# Altium footprint library XU-GENARAL PCB .PcbLib: 1176 footprints (part 43 of 75)
Each footprint in its own frame and in the unit in brackets; x right, y up, seen from the top. Pads: shape width x height; smd on the part's side, far side on the other; paste and mask are expansions set on the pad; w line width, h text height; cw(c..) or ccw(c..) is an arc to the next point about the centre after c.
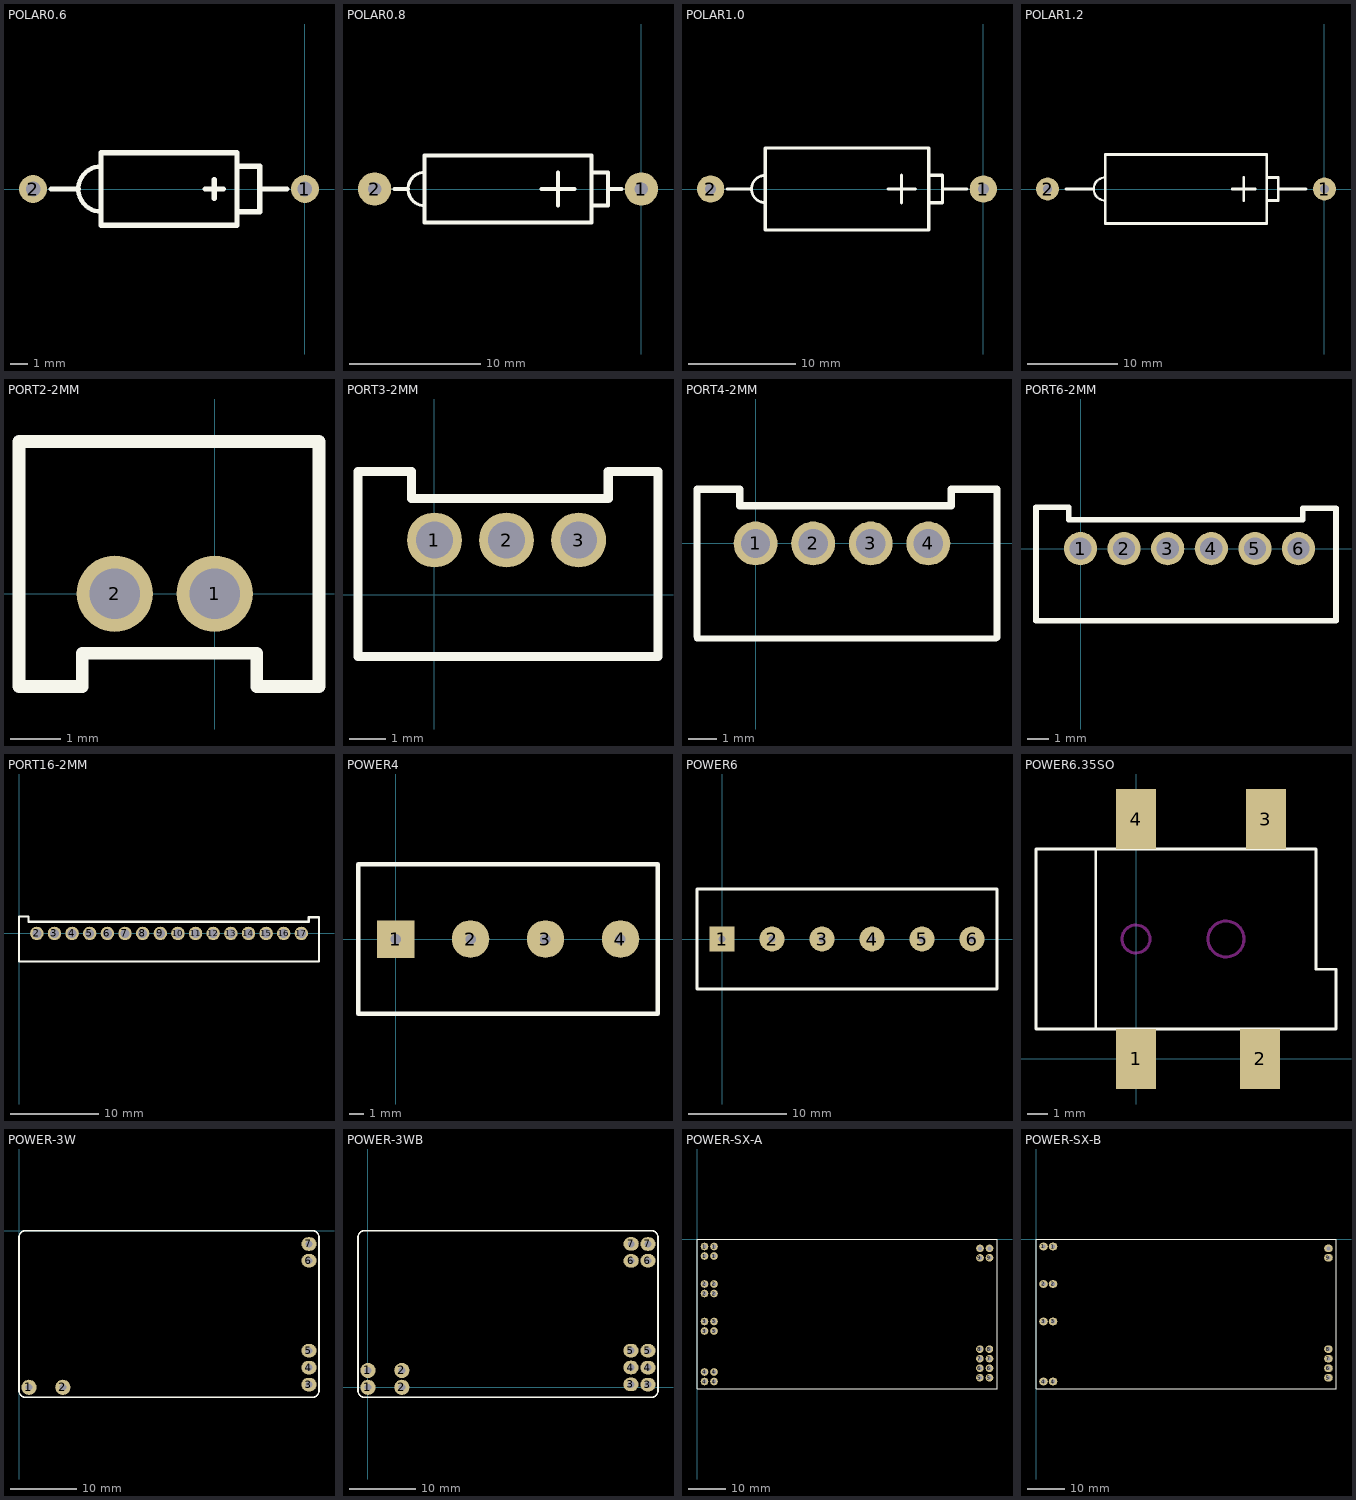
[diagram p42: the footprints below, top view; thin cyan lines are the x and y axes]

## POLAR0.6 [mil]
pads (2):
  round 62 hole 32: 1(0,0) 2(-600,0)
Top Overlay:
  lines w10: -450,-50 cw(c-450,0) -450,50
  lines w12: -560,0 -500,0 ; -220,0 -180,0 ; -200,-20 -200,20 ; -150,-50 -100,-50 -100,50 -150,50 ; -100,0 -40,0 ; -450,-80 -450,80 -150,80 -150,-80 -450,-80

## POLAR0.8 [mil]
pads (2):
  round 100 hole 40: 1(0,0) 2(-800,0)
Top Overlay:
  lines w10: -650,-50 cw(c-650,0) -650,50
  lines w12: -740,0 -700,0 ; -300,0 -200,0 ; -250,-50 -250,50 ; -150,-50 -100,-50 -100,50 -150,50 ; -100,0 -60,0 ; -650,-100 -650,100 -150,100 -150,-100 -650,-100

## POLAR1.0 [mil]
pads (2):
  round 100 hole 40: 1(0,0) 2(-1000,0)
Top Overlay:
  lines w10: -800,-50 cw(c-800,0) -800,50
  lines w12: -940,0 -850,0 ; -350,0 -250,0 ; -300,-50 -300,50 ; -200,-50 -150,-50 -150,50 -200,50 ; -150,0 -60,0 ; -800,-150 -800,150 -200,150 -200,-150 -800,-150

## POLAR1.2 [mil]
pads (2):
  round 100 hole 40: 1(0,0) 2(-1200,0)
Top Overlay:
  lines w10: -950,-50 cw(c-950,0) -950,50
  lines w12: -1120,0 -1000,0 ; -400,0 -300,0 ; -350,-50 -350,50 ; -250,-50 -200,-50 -200,50 -250,50 ; -200,0 -80,0 ; -950,-150 -950,150 -250,150 -250,-150 -950,-150

## PORT2-2MM [mil]
pads (2):
  round 60 hole 40: 1(0,0) 2(-78.74,0)
Top Overlay:
  lines w10: -154.2,-73.2 -104.3,-73.2 -104.3,-47 33.1,-47 33.1,-73.2 82.2,-73.2 82.2,120 -154.2,120 -154.2,-73.2

## PORT3-2MM [mil]
pads (3):
  round 60 hole 40: 1(0,60) 2(78.74,60) 3(157.48,60)
Top Overlay:
  lines w10: -83.6,-67.4 -26,-67.4 188,-67.4 244.3,-67.4 244.3,135 206.3,135 190,135 190,105.26 -25.1,105.26 -25.1,135 -83.6,135 -83.6,-67.4

## PORT4-2MM [mil]
pads (4):
  round 60 hole 40: 1(0,0) 2(78.74,0) 3(157.48,0) 4(236.22,0)
Top Overlay:
  lines w8: -80,-130 328.5,-130
  lines w10: -80,-127.2 -80,73.9 -21.6,73.9 -21.6,51.6 -2.9,51.6 ; -16.2,51.6 267.4,51.6 267.4,73.9 330,73.9 330,-128.5

## PORT6-2MM [mil]
pads (6):
  round 60 hole 40: 1(0,0) 2(78.74,0) 3(157.48,0) 4(236.22,0) 5(314.96,0) 6(393.7,0)
Top Overlay:
  lines w10: -80.4,-130 461.4,-130 461.4,73 401.1,73 401.1,52.4 -21.6,52.4 -21.6,74.6 -80.4,74.6 -80.4,-130

## PORT16-2MM [mil]
pads (16):
  round 60 hole 40: 2(78.74,0) 3(157.48,0) 4(236.22,0) 5(314.96,0) 6(393.7,0) 7(472.44,0) 8(551.18,0) 9(629.92,0) 10(708.66,0) 11(787.4,0) 12(866.14,0) 13(944.88,0) 14(1023.62,0) 15(1102.36,0) 16(1181.1,0) 17(1259.84,0)
Top Overlay:
  lines w10: -0.8,-125 1338.58,-125 1338.58,72.2 1292.9,72.2 1292.9,52.4 41.6,52.4 41.6,75.3 -0.8,75.3 -0.8,-125

## POWER4 [mil]
pads (4):
  rect 100x100 hole 28: 1(0,0)
  round 100 hole 28: 2(200,0) 3(400,0) 4(600,0)
Top Overlay:
  lines w12: -100,-200 -100,200 700,200 700,-200 -100,-200

## POWER6 [mil]
pads (6):
  rect 100x100 hole 28: 1(0,0)
  round 100 hole 28: 2(200,0) 3(400,0) 4(600,0) 5(800,0) 6(1000,0)
Top Overlay:
  lines w12: -100,-200 1100,-200 1100,200 -100,200 -100,-200

## POWER6.35SO [mm]
pads (4):
  rect 2x3 smd: 1(0,0) 2(6.2,0) 3(6.5,12) 4(0,12)
Top Overlay:
  lines w0.127: -4.009,1.5 -5,1.5 ; -4.009,10.5 -5,10.5 ; -2.003,1.5 -2.003,10.5 ; -5,1.5 9,1.5 10,1.5 10,4.497 9,4.497 9,10.5 -5,10.5 ; -5,1.5 -5,10.5
Keep-Out Layer:
  circle w0.152: c4.5,6 r0.9
  circle w0.152: c0,6 r0.7

## POWER-3W [mil]
pads (7):
  round 90 hole 40: 1(59.05,-925.2) 2(259.06,-925.2)
  oval 90x80 hole 40: 3(1712.6,-908.66) 4(1712.6,-808.66) 5(1712.6,-708.66) 6(1712.6,-177.16) 7(1712.6,-78.74)
Top Overlay:
  lines w10: 0,-944.88 ccw(c39.37,-944.88) 39.37,-984.25 1732.28,-984.25 ccw(c1732.28,-944.88) 1771.65,-944.88 1771.65,-39.37 ccw(c1732.28,-39.37) 1732.28,0 39.37,0 ccw(c39.37,-39.37) 0,-39.37 0,-944.88

## POWER-3WB [mil]
pads (14):
  round 90 hole 40: 1(0,0) 1(0,100) 2(200,0) 2(200,100)
  oval 90x80 hole 40: 3(1553,17) 3(1653.54,16.54) 4(1553,117) 4(1653.54,116.54) 5(1553,217) 5(1653.54,216.54) 6(1554,747) 6(1653.54,748.03) 7(1554,847) 7(1653.54,846.46)
Top Overlay:
  lines w10: -59.05,-19.68 ccw(c-19.68,-19.68) -19.68,-59.05 1673.23,-59.05 ccw(c1673.23,-19.68) 1712.6,-19.68 1712.6,885.83 ccw(c1673.23,885.83) 1673.23,925.2 -19.68,925.2 ccw(c-19.68,885.83) -59.05,885.83 -59.05,-19.68

## POWER-SX-A [mil]
pads (28):
  round 80 hole 40: 1(78.74,-178.74) 1(78.74,-78.74) 1(178.74,-178.74) 1(178.74,-78.74) 2(78.74,-572.44) 2(78.74,-472.44) 2(178.74,-572.44) 2(178.74,-472.44) 3(78.74,-966.14) 3(78.74,-866.14) 3(178.74,-966.14) 3(178.74,-866.14) 4(78.74,-1496.06) 4(78.74,-1396.06) 4(178.74,-1496.06) 4(178.74,-1396.06) 5(2970.06,-1456.2) 5(3070.6,-1456.66) 6(2970.06,-1356.2) 6(3070.6,-1356.66) 7(2970.06,-1256.2) 7(3070.6,-1256.66) 8(2970,-1156) 8(3070,-1156) 9(2971.06,-198.2) 9(3070.6,-197.16) 10(2971.06,-98.2) 10(3070.6,-98.74)
Top Overlay:
  lines w10: 0,-1574.8 0,0 3149.61,0 3149.61,-1574.8 0,-1574.8

## POWER-SX-B [mil]
pads (14):
  oval 90x80 hole 40: 1(78.74,-78.74) 1(178.74,-78.74) 2(78.74,-472.44) 2(178.74,-472.44) 3(78.74,-866.14) 3(178.74,-866.14) 4(78.74,-1496.06) 4(178.74,-1496.06) 5(3070.6,-1456.66) 6(3070.6,-1356.66) 7(3070.6,-1256.66) 8(3070,-1156) 9(3070.6,-197.16) 10(3070.6,-98.74)
Top Overlay:
  lines w10: 0,-1574.8 0,0 3149.61,0 3149.61,-1574.8 0,-1574.8